# Altium footprint library Module.PcbLib: 26 footprints (part 1 of 2)
Each footprint in its own frame and in the unit in brackets; x right, y up, seen from the top. Pads: shape width x height; smd on the part's side, far side on the other; paste and mask are expansions set on the pad; w line width, h text height; cw(c..) or ccw(c..) is an arc to the next point about the centre after c.
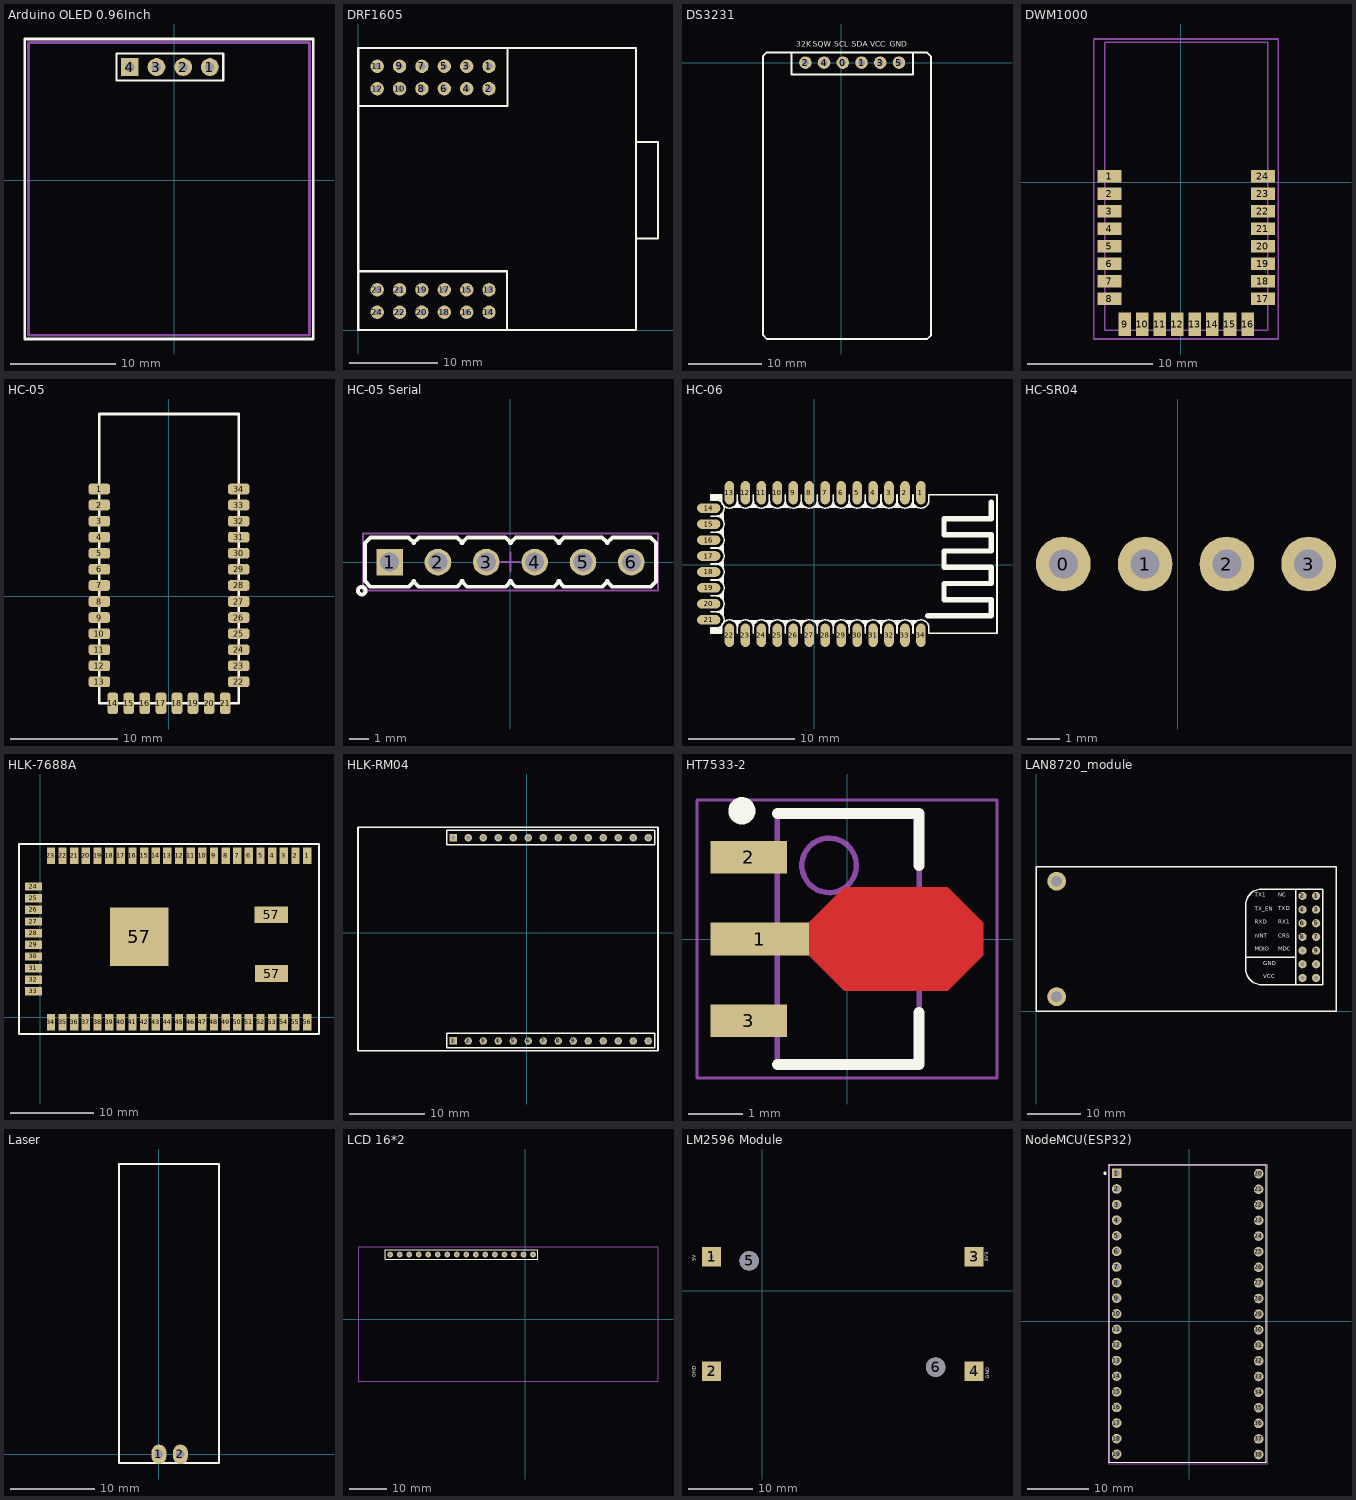
[diagram p0: the footprints below, top view; thin cyan lines are the x and y axes]

## Arduino OLED 0.96Inch [mm]
pads (4):
  round 1.7 hole 0.9: 1(3.404,10.77) 2(0.864,10.77) 3(-1.676,10.77)
  rect 1.7x1.7 hole 0.9: 4(-4.216,10.77)
Top Overlay:
  lines w0.2: -5.486,9.5 -5.486,12.04 4.674,12.04 4.674,9.5 -5.486,9.5
  lines w0.254: -14.199,-15.088 -14.199,13.437 13.233,13.437 13.233,-15.088 -14.199,-15.088
Mechanical 15:
  lines w0.254: -13.843,-14.732 12.878,-14.732 12.878,13.106 -13.843,13.106 -13.843,-14.732
3D body "User Library-128x64I2COLEDDisplayAdafruit.STEP": height 13.47, standoff 2.63, extent -13.858,-14.732 12.842,13.128
3D body "HDR2.54-1P_M.STEP": height 8.5, standoff -3, extent -2.946,9.5 -0.406,12.04
3D body "HDR2.54-1P_M.STEP": height 8.5, standoff -3, extent -5.486,9.5 -2.946,12.04
3D body "HDR2.54-1P_M.STEP": height 8.5, standoff -3, extent 2.134,9.5 4.674,12.04
3D body "HDR2.54-1P_M.STEP": height 8.5, standoff -3, extent -0.406,9.5 2.134,12.04

## DRF1605 [mil]
pads (24):
  round 60 hole 30: 1(585,1180) 2(585,1080) 3(485,1180) 4(485,1080) 5(385,1180) 6(385,1080) 7(285,1180) 8(285,1080) 9(185,1180) 10(185,1080) 11(85,1180) 12(85,1080) 13(585,180) 14(585,80) 15(485,180) 16(485,80) 17(385,180) 18(385,80) 19(285,180) 20(285,80) 21(185,180) 22(185,80) 23(85,180) 24(85,80)
Top Overlay:
  lines w10: -1,263 666,263 666,2 ; -1,1002 668,1002 668,1261 ; 1242,409 1341,409 1341,841 1242,841 ; 0,0 1242,0 1242,1262 0,1262 0,0

## DS3231 [mm]
pads (6):
  round 1.7 hole 0.9: 0(0.203,0) 1(2.743,0) 2(-4.877,0) 3(5.283,0) 4(-2.337,0) 5(7.823,0)
Top Overlay:
  lines w0.254: -6.731,1.372 -6.731,-1.6 0.406,-1.6 9.703,-1.6 9.703,1.372 ; -6.731,1.372 9.703,1.372 ; -6.731,1.372 -10.135,1.372 -10.643,0.864 -10.643,-36.932 -10.084,-37.49 -7.925,-37.49 10.185,-37.49 11.659,-37.49 12.192,-36.957 12.192,0.787 11.608,1.372 9.703,1.372
  text "32K" at -6.134,1.898 h1.3
  text "SQW" at -3.902,1.887 h1.3
  text "VCC" at 3.959,1.887 h1.3
  text "GND" at 6.579,1.887 h1.3
  text "SCL" at -0.976,1.887 h1.3
  text "SDA" at 1.406,1.887 h1.3
3D body "DS3231 Timer Assembly.stp": height 11.63, standoff -6, extent -10.116,-37.121 11.684,1.219

## DWM1000 [mm]
pads (24):
  rect 1.905x1 smd: 1(-5.696,0.505) 2(-5.696,-0.895) 3(-5.696,-2.295) 4(-5.696,-3.695) 5(-5.696,-5.095) 6(-5.696,-6.495) 7(-5.696,-7.895) 8(-5.696,-9.295) 17(6.559,-9.295) 18(6.559,-7.895) 19(6.559,-6.495) 20(6.559,-5.095) 21(6.559,-3.695) 22(6.559,-2.295) 23(6.559,-0.895) 24(6.559,0.505)
  rect 1x1.905 smd: 9(-4.468,-11.318) 10(-3.068,-11.318) 11(-1.668,-11.318) 12(-0.268,-11.318) 13(1.132,-11.318) 14(2.532,-11.318) 15(3.932,-11.318) 16(5.332,-11.318)
Mechanical 13:
  lines w0.127: -6.068,-11.795 -6.068,11.205 6.932,11.205 6.932,-11.795 -6.068,-11.795
Mechanical 15:
  lines w0.127: -6.934,-12.497 -6.934,11.455 7.772,11.455 7.772,-12.497 -6.934,-12.497
3D body "DWM1000 Module.STEP": height 2.9, standoff 0, extent -6.194,-11.887 7.006,11.113

## HC-05 [mm]
pads (34):
  rrect50% 2x1 smd: 1(-6.5,10) 2(-6.5,8.5) 3(-6.5,7) 4(-6.5,5.5) 5(-6.5,4) 6(-6.5,2.5) 7(-6.5,1) 8(-6.5,-0.5) 9(-6.5,-2) 10(-6.5,-3.5) 11(-6.5,-5) 12(-6.5,-6.5) 13(-6.5,-8) 22(6.5,-8) 23(6.5,-6.5) 24(6.5,-5) 25(6.5,-3.5) 26(6.5,-2) 27(6.5,-0.5) 28(6.5,1) 29(6.5,2.5) 30(6.5,4) 31(6.5,5.5) 32(6.5,7) 33(6.5,8.5) 34(6.5,10)
  rrect50% 1x2 smd: 14(-5.254,-10) 15(-3.754,-10) 16(-2.254,-10) 17(-0.754,-10) 18(0.746,-10) 19(2.246,-10) 20(3.746,-10) 21(5.246,-10)
Top Overlay:
  lines w0.254: -6.5,-10 6.5,-10 6.5,17 -6.5,17 -6.5,-10
3D body "User Library-Module Bluetooth.STEP": height 2.5, standoff 0.06, extent -6.501,-9.768 6.501,17.133

## HC-05 Serial [mm] "HC05 box"
height 40
pads (6):
  rect 1.4x1.4 / inner rect 1.4x1.4 / far side rect 1.4x2.2 hole 1 mask+0.1: 1(-6.35,0)
  round 1.4 / inner round 1.4 / far side oval 1.4x2.2 hole 1 mask+0.1: 2(-3.81,0) 3(-1.27,0) 4(1.27,0) 5(3.81,0) 6(6.35,0)
Top Overlay:
  circle w0.2: c-7.81,-1.5 r0.2
  lines w0.2: -5.11,-1 -4.81,-1.3 -2.81,-1.3 -2.51,-1 ; -5.11,1 -4.81,1.3 -2.81,1.3 -2.51,1 ; -5.05,-1 -5.35,-1.3 -7.35,-1.3 -7.65,-1 -7.65,1 -7.35,1.3 -5.35,1.3 -5.05,1 ; -2.57,-1 -2.27,-1.3 -0.27,-1.3 0.03,-1 ; -2.57,1 -2.27,1.3 -0.27,1.3 0.03,1 ; -0.025,-1 0.275,-1.3 2.275,-1.3 2.575,-1 ; -0.025,1 0.275,1.3 2.275,1.3 2.575,1 ; 2.515,-1 2.815,-1.3 4.815,-1.3 5.115,-1 ; 2.515,1 2.815,1.3 4.815,1.3 5.115,1 ; 5.055,-1 5.355,-1.3 7.355,-1.3 7.64,-1.015 7.64,1.015 7.355,1.3 5.355,1.3 5.055,1
Mechanical 15:
  lines w0.1: -0.5,0 0.5,0 ; 0,-0.5 0,0.5 ; -7.75,-1.5 -7.75,1.5 7.75,1.5 7.75,-1.5 -7.75,-1.5
3D body "User Library-hc05.STEP": height 40, standoff -2.6, extent -8.025,-0.5 8.075,5.4

## HC-06 [mm] "ï¿½ï¿½ï¿½ï¿½ï¿½ï¿½ï¿½ï¿½Ä£ï¿½ï¿½2.0"
pads (34):
  oval 0.9x2.2 smd: 1(10.025,6.75) 2(8.525,6.75) 3(7.025,6.75) 4(5.525,6.75) 5(4.025,6.75) 6(2.525,6.75) 7(1.025,6.75) 8(-0.475,6.75) 9(-1.975,6.75) 10(-3.475,6.75) 11(-4.975,6.75) 12(-6.475,6.75) 13(-7.975,6.75) 22(-7.975,-6.65) 23(-6.475,-6.65) 24(-4.975,-6.65) 25(-3.475,-6.65) 26(-1.975,-6.65) 27(-0.475,-6.65) 28(1.025,-6.65) 29(2.525,-6.65) 30(4.025,-6.65) 31(5.525,-6.65) 32(7.025,-6.65) 33(8.525,-6.65) 34(10.025,-6.65)
  oval 2.2x0.9 smd: 14(-9.925,5.3) 15(-9.925,3.8) 16(-9.925,2.3) 17(-9.925,0.8) 18(-9.925,-0.7) 19(-9.925,-2.2) 20(-9.925,-3.7) 21(-9.925,-5.2)
Top Overlay:
  drawing of 195 lines, arcs and shapes, not listed
3D body "User Library-Bluetooth HC-06_.step": height 2.35, standoff 0, extent -9.738,-6.96 18.272,7.06

## HC-SR04 [mm] "ï¿½ï¿½ï¿½ï¿½ï¿½ï¿½ï¿½ï¿½ï¿½Ä£ï¿½ï¿½"
pads (4):
  round 1.7 hole 0.9: 0(-3.556,8.712) 1(-1.016,8.712) 2(1.524,8.712) 3(4.064,8.712)
3D body "Ultrosonic HC-SR04.STEP": height 20.5, standoff -4.68, extent -22.5,-9.034 22.5,9.034

## HLK-7688A [mm]
height 3.1
pads (59):
  rect 1x2 smd: 1(32.1,19.4) 2(30.7,19.4) 3(29.3,19.4) 4(27.9,19.4) 5(26.5,19.4) 6(25.1,19.4) 7(23.7,19.4) 8(22.3,19.4) 9(20.9,19.4) 10(19.5,19.4) 11(18.1,19.4) 12(16.7,19.4) 13(15.3,19.4) 14(13.9,19.4) 15(12.5,19.4) 16(11.1,19.4) 17(9.7,19.4) 18(8.3,19.4) 19(6.9,19.4) 20(5.5,19.4) 21(4.1,19.4) 22(2.7,19.4) 23(1.3,19.4) 34(1.3,-0.6) 35(2.7,-0.6) 36(4.1,-0.6) 37(5.5,-0.6) 38(6.9,-0.6) 39(8.3,-0.6) 40(9.7,-0.6) 41(11.1,-0.6) 42(12.5,-0.6) 43(13.9,-0.6) 44(15.3,-0.6) 45(16.7,-0.6) 46(18.1,-0.6) 47(19.5,-0.6) 48(20.9,-0.6) 49(22.3,-0.6) 50(23.7,-0.6) 51(25.1,-0.6) 52(26.5,-0.6) 53(27.9,-0.6) 54(29.3,-0.6) 55(30.7,-0.6) 56(32.1,-0.6)
  rect 2x1 smd: 24(-0.8,15.7) 25(-0.8,14.3) 26(-0.8,12.9) 27(-0.8,11.5) 28(-0.8,10.1) 29(-0.8,8.7) 30(-0.8,7.3) 31(-0.8,5.9) 32(-0.8,4.5) 33(-0.8,3.1)
  rect 7x7 smd: 57(11.925,9.675)
  rect 4x2 smd: 57(27.8,12.3) 57(27.825,5.25)
Top Overlay:
  lines w0.254: -2.54,-2.032 33.528,-2.032 33.528,20.828 33.02,20.828 -2.54,20.828 -2.54,-2.032
3D body "HLK-7688A.STEP": height 3.1, standoff 0, extent 0,0 33.2,18.7

## HLK-RM04 [mm]
pads (28):
  rect 1x1 hole 0.6: 1(-9.827,-14.412) 28(-9.827,12.688)
  round 1 hole 0.6: 2(-7.827,-14.412) 3(-5.827,-14.412) 4(-3.827,-14.412) 5(-1.827,-14.412) 6(0.173,-14.412) 7(2.173,-14.412) 8(4.173,-14.412) 9(6.173,-14.412) 10(8.173,-14.412) 11(10.173,-14.412) 12(12.173,-14.412) 13(14.173,-14.412) 14(16.173,-14.412) 15(16.173,12.688) 16(14.173,12.688) 17(12.173,12.688) 18(10.173,12.688) 19(8.173,12.688) 20(6.173,12.688) 21(4.173,12.688) 22(2.173,12.688) 23(0.173,12.688) 24(-1.827,12.688) 25(-3.827,12.688) 26(-5.827,12.688) 27(-7.827,12.688)
Top Overlay:
  lines w0.2: -10.727,-15.312 17.073,-15.312 17.073,-13.412 -10.727,-13.412 -10.727,-15.312 ; -10.727,11.788 -10.727,13.688 17.073,13.688 17.073,11.788 -10.727,11.788
  lines w0.254: -22.527,-15.712 -22.527,14.088 17.473,14.088 17.473,-15.712 -22.527,-15.712
3D body "HLK RM04.STEP": height 5.5, standoff -5, extent -22.727,-15.512 17.273,13.788

## HT7533-2 [mm] "SOT89, 3-Leads, Body 4.49x2.45mm, Pitch 1.50mm, Lead Span 4.1mm, IPC Medium Density"
height 1.6
pads (3):
  rect 1.8x0.6 smd: 1(-1.6,0)
  rect 1.4x0.6 smd: 2(-1.8,1.5) 3(-1.8,-1.5)
Top Layer:
  region: -0.7,0.3 -0.05,0.95 1.85,0.95 2.5,0.3 2.5,-0.3 1.85,-0.95 -0.05,-0.95 -0.7,-0.3
Top Overlay:
  circle w0.25: c-1.927,2.35 r0.125
  lines w0.2: -1.278,-2.3 1.322,-2.3 1.322,-1.35 ; -1.278,2.3 1.322,2.3 1.322,1.35
Mechanical 13:
  circle w0.1: c-0.327,1.35 r0.5
  lines w0.1: -1.278,-2.3 1.322,-2.3 1.322,2.3 -1.278,2.3 -1.278,-2.3
Mechanical 15:
  lines w0.05: -2.75,-2.55 2.75,-2.55 2.75,2.55 -2.75,2.55 -2.75,-2.55
  lines w0.1: -0.477,0 0.523,0 ; 0.022,-0.5 0.022,0.5
3D body "HT7533-2.step": height 1.6, standoff 0, extent -2.2,-2.3 1.85,2.3

## LAN8720_module [mil]
pads (16):
  round 60 hole 30: 1(2050.73,843.17) 2(1950.73,843.17) 3(2050.73,743.17) 4(1950.73,743.17) 5(2050.73,643.17) 6(1950.73,643.17) 7(2050.73,543.17) 8(1950.73,543.17) 9(2050.73,443.17) 10(1950.73,443.17) 11(1950.73,243.17) 11(2050.73,243.17) 12(1950.73,343.17) 12(2050.73,343.17)
  round 137.8 hole 78.74: ""(151,106) ""(151,951)
Top Overlay:
  lines w10: 1535,301.94 1535,769 cw(c1651.5,776.5) 1643.99,893 1900,893 ; 1535.41,301.94 ccw(c1651.91,309.44) 1659.41,192.95 ; 1537,394 1900,394 ; 1645.66,192.87 1900,193 ; 1900,193 1900,893 ; 1900,193 2100,193 2100,893 1900,893 ; 0,0 0,1056 2196,1056 2196,0 0,0
  text "VCC" at 1665.05,229.57 h51.18
  text "GND" at 1663,324.57 h51.18
  text "MDC" at 1775,429.57 h51.18
  text "MDIO" at 1602,429.57 h51.18
  text "nINT" at 1602,525 h51.18
  text "CRS" at 1775,525.57 h51.18
  text "RX1" at 1775,629 h51.18
  text "RXD" at 1602,629 h51.18
  text "TX_EN" at 1602,725.08 h51.18
  text "TXD" at 1775,726 h51.18
  text "TX1" at 1602,826 h51.18
  text "NC" at 1775,826.57 h51.18
3D body "HDR2.54-1P_M.STEP": height 334.65, standoff -118.11, extent 2000.73,793.17 2100.73,893.17
3D body "HDR2.54-1P_M.STEP": height 334.65, standoff -118.11, extent 1900.73,793.17 2000.73,893.17
3D body "HDR2.54-1P_M.STEP": height 334.65, standoff -118.11, extent 2000.73,693.17 2100.73,793.17
3D body "HDR2.54-1P_M.STEP": height 334.65, standoff -118.11, extent 1900.73,693.17 2000.73,793.17
3D body "HDR2.54-1P_M.STEP": height 334.65, standoff -118.11, extent 2000.73,593.17 2100.73,693.17
3D body "HDR2.54-1P_M.STEP": height 334.65, standoff -118.11, extent 1900.73,593.17 2000.73,693.17
3D body "HDR2.54-1P_M.STEP": height 334.65, standoff -118.11, extent 2000.73,493.17 2100.73,593.17
3D body "HDR2.54-1P_M.STEP": height 334.65, standoff -118.11, extent 1900.73,493.17 2000.73,593.17
3D body "HDR2.54-1P_M.STEP": height 334.65, standoff -118.11, extent 2000.73,393.17 2100.73,493.17
3D body "HDR2.54-1P_M.STEP": height 334.65, standoff -118.11, extent 1900.73,393.17 2000.73,493.17
3D body "HDR2.54-1P_M.STEP": height 334.65, standoff -118.11, extent 2000.73,293.17 2100.73,393.17
3D body "HDR2.54-1P_M.STEP": height 334.65, standoff -118.11, extent 1900.73,293.17 2000.73,393.17
3D body "HDR2.54-1P_M.STEP": height 334.65, standoff -118.11, extent 2000.73,193.17 2100.73,293.17
3D body "HDR2.54-1P_M.STEP": height 334.65, standoff -118.11, extent 1900.73,193.17 2000.73,293.17

## Laser [mil]
pads (2):
  oval 70x90 hole 40: 1(0,0) 2(100,0)
Top Overlay:
  lines w10: -186.22,-40 -186.22,1349.21 280,1349.21 280,-40 -186.22,-40
3D body "laser.STEP": height 472.44, standoff 0, extent -186.22,50 286.22,1435.83
3D body: height 241.21, standoff 231.23, extent 45,1160 54.96,2160

## LCD 16*2 [mil]
pads (16):
  round 60 hole 30: 1(-1420,678) 2(-1320,678) 3(-1220,678) 4(-1120,678) 5(-1020,678) 6(-920,678) 7(-820,678) 8(-720,678) 9(-620,678) 10(-520,678) 11(-420,678) 12(-320,678) 13(-220,678) 14(-120,678) 15(-20,678) 16(80,678)
Top Overlay:
  lines w10: -1470,629 -1470,728 -1469,728 129,728 130,727 130,628 129,629 -1470,629
Mechanical 1:
  lines w10: -1757,-652 1392,-652 1392,760 -1757,760 -1757,-652
3D body "LCD 16X2.STEP": height 763.78, standoff 98.43, extent -1757.61,-649.72 1392,759.72
3D body "HDR2.54-1P_M.STEP": height 334.65, standoff -118.11, extent 30,628.01 130,728.01
3D body "HDR2.54-1P_M.STEP": height 334.65, standoff -118.11, extent -70,628.01 30,728.01
3D body "HDR2.54-1P_M.STEP": height 334.65, standoff -118.11, extent -170,628.01 -70,728.01
3D body "HDR2.54-1P_M.STEP": height 334.65, standoff -118.11, extent -270,628.01 -170,728.01
3D body "HDR2.54-1P_M.STEP": height 334.65, standoff -118.11, extent -370,628.01 -270,728.01
3D body "HDR2.54-1P_M.STEP": height 334.65, standoff -118.11, extent -470,628.01 -370,728.01
3D body "HDR2.54-1P_M.STEP": height 334.65, standoff -118.11, extent -570,628.01 -470,728.01
3D body "HDR2.54-1P_M.STEP": height 334.65, standoff -118.11, extent -670,628.01 -570,728.01
3D body "HDR2.54-1P_M.STEP": height 334.65, standoff -118.11, extent -770,628.01 -670,728.01
3D body "HDR2.54-1P_M.STEP": height 334.65, standoff -118.11, extent -870,628.01 -770,728.01
3D body "HDR2.54-1P_M.STEP": height 334.65, standoff -118.11, extent -970,628.01 -870,728.01
3D body "HDR2.54-1P_M.STEP": height 334.65, standoff -118.11, extent -1070,628.01 -970,728.01
3D body "HDR2.54-1P_M.STEP": height 334.65, standoff -118.11, extent -1170,628.01 -1070,728.01
3D body "HDR2.54-1P_M.STEP": height 334.65, standoff -118.11, extent -1270,628.01 -1170,728.01
3D body "HDR2.54-1P_M.STEP": height 334.65, standoff -118.11, extent -1370,628.01 -1270,728.01
3D body "HDR2.54-1P_M.STEP": height 334.65, standoff -118.11, extent -1470,628.01 -1370,728.01

## LM2596 Module [mil]
height 137.8
pads (6):
  rect 118.11x118.11 hole 30: 1(-310.5,207) 2(-310.5,-493) 3(1294.5,207) 4(1294.5,-493)
  round 118.11 hole 118.11: 5(-80.5,182) 6(1059.5,-468)
Top Overlay:
  text "5V" at -397.3,179.44 h39.37
  text "GND" at -399.66,-529.22 h39.37
  text "GND" at 1395.62,-537.49 h39.37
  text "3V3" at 1390.11,177.87 h39.37
3D body "LM2596 Module.SLDPRT": height 440.25, standoff -97.16, extent -375.5,-558 1356.79,268.77

## NodeMCU(ESP32) [mm]
pads (38):
  rect 1.56x1.56 hole 1.04: 1(-11.786,24.054)
  round 1.56 hole 1.04: 2(-11.786,21.514) 3(-11.786,18.974) 4(-11.786,16.434) 5(-11.786,13.894) 6(-11.786,11.354) 7(-11.786,8.814) 8(-11.786,6.274) 9(-11.786,3.734) 10(-11.786,1.194) 11(-11.786,-1.346) 12(-11.786,-3.886) 13(-11.786,-6.426) 14(-11.786,-8.966) 15(-11.786,-11.506) 16(-11.786,-14.046) 17(-11.786,-16.586) 18(-11.786,-19.126) 19(-11.786,-21.666) 20(11.328,24.002) 21(11.328,21.462) 22(11.328,18.922) 23(11.328,16.382) 24(11.328,13.842) 25(11.328,11.302) 26(11.328,8.762) 27(11.328,6.222) 28(11.328,3.682) 29(11.328,1.142) 30(11.328,-1.398) 31(11.328,-3.938) 32(11.328,-6.478) 33(11.328,-9.018) 34(11.328,-11.558) 35(11.328,-14.098) 36(11.328,-16.638) 37(11.328,-19.178) 38(11.328,-21.718)
Top Overlay:
  circle w0.28: c-13.691,24.054 r0.14
  lines w0.127: -13.056,-23.008 12.578,-23.008 12.578,25.451 -13.056,25.451 -13.056,-23.008
Mechanical 13:
  lines w0.127: -13.056,-23.008 -13.056,25.451 12.578,25.451 12.578,-23.008 -13.056,-23.008
Mechanical 15:
  lines w0.05: -13.183,-23.258 -13.183,25.578 12.828,25.578 12.828,-23.258 -13.183,-23.258
3D body "ESP32Wroom.stp": height 7.07, standoff -5.93, extent -12.958,-23.74 12.442,25.306